# Altium footprint library My_SOMA_1806211.PcbLib: 50 footprints (part 1 of 4)
Each footprint in its own frame and in the unit in brackets; x right, y up, seen from the top. Pads: shape width x height; smd on the part's side, far side on the other; paste and mask are expansions set on the pad; w line width, h text height; cw(c..) or ccw(c..) is an arc to the next point about the centre after c.
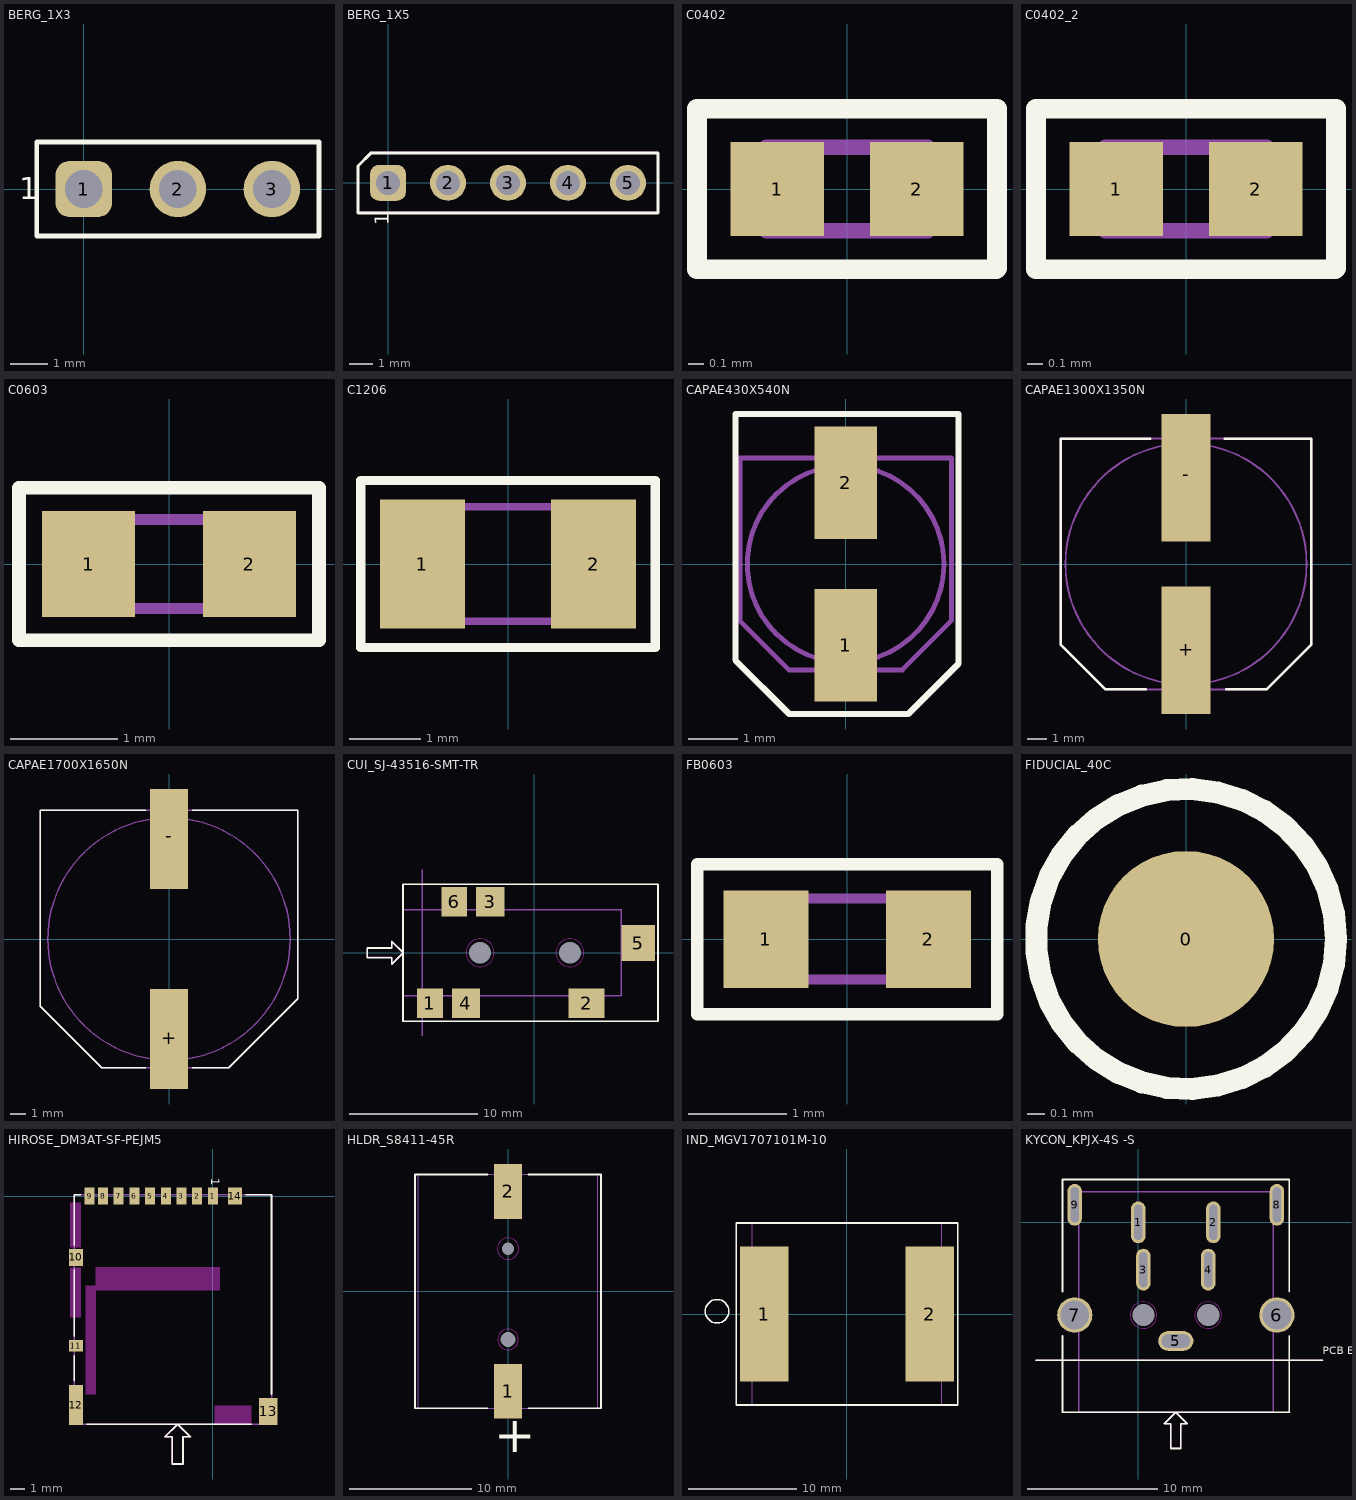
[diagram p0: the footprints below, top view; thin cyan lines are the x and y axes]

## BERG_1X3 [mil] "3 PIN CONNECTOR"
height 439.76
pads (3):
  rrect50% 60x60 hole 40 mask+2: 1(0,0)
  round 60 hole 40 mask+2: 2(100,0) 3(200,0)
Top Overlay:
  lines w5: -50,-50 250,-50 250,50 -50,50 -50,-50
  text "1" at -68.9,-18.9 h40
Mechanical 13:
  lines w4: -50,-50 250,-50 250,50 -50,50 -50,-50
  text "1" at -82.35,6.72 h40
  text ".Designator" at 264.98,27.44 h40
3D body "22-03-2031.stp": height 426.14, standoff -133.86, extent -45,-46.5 245,46.5

## BERG_1X5 [mil] "5 PIN CONNECTOR"
height 11.17
pads (5):
  rrect50% 60x60 hole 40 mask+2: 1(0,0)
  round 60 hole 40 mask+2: 2(100,0) 3(200,0) 4(300,0) 5(400,0)
Top Overlay:
  lines w5: -50,-50 -50,28.06 -28.06,50 450,50 450,-50 -50,-50
  text "1" at 9.74,-70.59 h40
Mechanical 13:
  lines w4: -50,-50 -50,28.06 -28.06,50 450,50 450,-50 -50,-50
  text "5" at 400,-13 h40
  text "1" at -5,-13 h40
  text ".Designator" at -73.18,-36.72 h40
3D body "22-03-2051.stp": height 426.14, standoff -133.86, extent -45.24,-46.75 444.75,46.25

## C0402 [mil]
height 590.55
pads (2):
  rect 24x24 smd mask+2: 1(-17.83,0) 2(17.83,0)
Top Overlay:
  lines w5: -38.33,-20.5 -38.33,20.5 38.33,20.5 38.33,-20.27 38.1,-20.5 -38.33,-20.5
Mechanical 13:
  lines w4: -20.67,-10.63 -20.67,10.63 20.67,10.63 20.67,-10.63 -20.67,-10.63
  text ".Designator" at -35.52,16.95 h40
3D body "C0402.STEP": height 20.1, standoff 0, extent -19.99,-9.99 20.01,10.01

## C0402_2 [mil]
pads (2):
  rect 24x24 smd mask+2: 1(-17.83,0) 2(17.83,0)
Top Overlay:
  lines w5: -38.33,-20.5 38.1,-20.5 38.33,-20.27 38.33,20.5 -38.33,20.5 -38.33,-20.5
Mechanical 13:
  lines w4: -20.67,-10.63 20.67,-10.63 20.67,10.63 -20.67,10.63 -20.67,-10.63
  text ".Designator" at -33.94,-47.33 h40
3D body "C0402.STEP": height 20.1, standoff 0, extent -19.99,-9.99 20.01,10.01

## C0603 [mil]
pads (2):
  rect 34x39 smd mask+2: 1(-29.48,0) 2(29.48,0)
Top Overlay:
  lines w5: -54.98,-28 -54.98,28 54.98,28 54.98,-28 -54.98,-28
Mechanical 13:
  lines w4: -31.5,-16.24 31.5,-16.24 31.5,16.24 -31.5,16.24 -31.5,-16.24
  text ".Designator" at 29.67,-27.66 h40
3D body "0603_SMD.stp": height 11.89, standoff 0, extent -31.54,-15.72 31.46,15.78

## C1206 [mil]
height 590.55
pads (2):
  rect 47x71 smd mask+2: 1(-47.09,0) 2(47.09,0)
Top Overlay:
  lines w5: -81.09,-46 -81.09,46 81.09,46 81.09,-46 -81.09,-46
Mechanical 13:
  lines w4: -62.99,-31.5 62.99,-31.5 62.99,31.5 -62.99,31.5 -62.99,-31.5
  text ".Designator" at 31.82,14.59 h40
3D body "C1206.STEP": height 39.45, standoff 0, extent -62.99,-31.49 63,31.5

## CAPAE430X540N [mm] "EEE-1VA100WR,CAP ALUM 10UF 20% 35V SMD"
height 5.4
pads (2):
  rect 1.27x2.286 smd mask+0.05: 1(0,-1.65) 2(0,1.65)
Top Overlay:
  lines w0.127: -2.239,-1.952 -1.143,-3.048 1.27,-3.048 2.297,-2.021 2.297,3.048 -2.239,3.048 -2.239,-1.952
Mechanical 13:
  circle w0.102: c0,0 r2
  lines w0.102: -2.15,-1.152 -1.152,-2.15 1.152,-2.15 2.15,-1.152 2.15,2.15 -2.15,2.15 -2.15,-1.152
  text ".Designator" at 0.127,-0.845 h1.02
3D body "猞4 SIZE CODE B.stp": height 5.81, standoff 0.01, extent -2.15,-2.5 2.15,2.5

## CAPAE1300X1350N [mm] "EMVA250ARA102MKE0S,CAP ALUM 1000UF 20% 25V SMD"
height 14
pads (2):
  rect 2.54x6.604 smd mask+0.05: +(0,-4.475) -(0,4.475)
Top Overlay:
  lines w0.127: -2.084,-6.5 -4.168,-6.5 -6.5,-4.168 -6.5,6.5 -1.847,6.5 ; 2.006,6.5 6.5,6.5 6.5,-4.168 4.168,-6.5 2.084,-6.5
Mechanical 13:
  circle w0.102: c0,0 r6.25
  lines w0.102: -6.5,-4.168 -4.168,-6.5 4.168,-6.5 6.5,-4.168 6.5,6.5 -6.5,6.5 -6.5,-4.168
  text ".Designator" at -0.306,0.532 h1.02
3D body: height 3, standoff 0, extent -6.5,-6.5 6.5,6.5
3D body: height 13.5, standoff 3, extent -6.25,-6.247 6.25,6.247

## CAPAE1700X1650N [mm] "EEV-TG1J471M,CAP ALUM 470UF 20% 63V SMD"
height 16.5
pads (2):
  rect 2.54x6.604 smd mask+0.05: +(0,-6.6) -(0,6.6)
Top Overlay:
  lines w0.127: -1.547,-8.5 -4.454,-8.5 -8.5,-4.454 -8.5,8.5 -1.535,8.5 ; 1.535,-8.5 3.946,-8.5 8.5,-3.946 8.5,8.5 1.547,8.5
Mechanical 13:
  circle w0.102: c0,0 r8
  lines w0.102: -8.5,-4.454 -8.5,8.5 8.5,8.5 8.5,-3.946 3.946,-8.5 -4.454,-8.5 -8.5,-4.454
  text ".Designator" at -0.071,0.847 h1.02
3D body "CAPAE180170X170M.step": height 17, standoff 0, extent -8.5,-9 8.5,9

## CUI_SJ-43516-SMT-TR [mm] "CONN JACK 4COND 3.5MM SMD R/A,SJ-43516-SMT-TR"
height 5
pads (8):
  rect 2x2.3 smd mask+0.051: 1(-8.1,-3.95) 6(-6.2,3.95)
  rect 2.8x2.3 smd mask+0.051: 2(4.1,-3.95)
  rect 2.2x2.3 smd mask+0.051: 3(-3.4,3.95) 4(-5.3,-3.95)
  rect 2.6x2.8 smd mask+0.051: 5(8.1,0.75)
  round 0 hole 1.7 unplated mask+0.051: ""(-4.2,0) ""(2.8,0)
Top Overlay:
  lines w0.127: -11.08,0.372 -12.985,0.372 -12.985,-0.39 -11.08,-0.39 -11.08,-0.898 -10.191,-0.009 -11.08,0.88 -11.08,0.373 ; -10.2,-5.334 9.652,-5.334 9.652,5.334 -10.2,5.334 -10.2,-5.334
Keep-Out Layer:
  circle w0.051: c2.8,0 r1.089
  circle w0.051: c-4.2,0 r1.089
Mechanical 13:
  lines w0.102: -11.08,0.39 -12.985,0.39 -12.985,-0.372 -11.08,-0.372 -11.08,-0.88 -10.191,0.009 -11.08,0.898 -11.08,0.392 ; -8.7,-6.477 -8.7,-3.35 -8.7,3.35 -8.7,6.477 ; -10.2,-3.35 6.8,-3.35 6.8,3.35 -10.2,3.35 -10.2,-3.35
  text ".Designator" at -1.302,0.331 h1.02
3D body "SJ-43516-SMT-TR.step": height 5.1, standoff -0.7, extent -10.4,-4.5 8.8,4.5

## FB0603 [mil]
height 590.55
pads (2):
  rect 34x39 smd mask+4: 1(-32.5,0) 2(32.5,0)
Top Overlay:
  lines w5: -60,-30 60,-30 60,30 -60,30 -60,-30
Mechanical 13:
  lines w4: -31.5,-16.24 31.5,-16.24 31.5,16.24 -31.5,16.24 -31.5,-16.24
  text ".Designator" at -32.67,-52.8 h40
3D body "User Library-R_0603.STEP": height 19.68, standoff 0, extent -31.49,-17.71 31.5,17.72

## FIDUCIAL_40C [mil] "GLOBAL FIDUCIAL"
height 590.55
pads (1):
  round 40 smd paste-78.74 mask+10: 0(0,0)
Top Layer keep-out:
  circle w2: c0,0 r34
Top Overlay:
  circle w5: c0,0 r34
Mechanical 13:
  circle w4: c0,0 r34
  text ".Designator" at 55.03,36.81 h40

## HIROSE_DM3AT-SF-PEJM5 [mm] "HIROSE_DM3AT-SF-PEJM5"
height 1.83
pads (14):
  rect 0.7x1.2 smd mask+0.051: 1(0,0) 2(-1.1,0) 3(-2.2,0) 4(-3.3,0) 5(-4.4,0) 6(-5.5,0) 7(-6.6,0) 8(-7.7,0) 9(-8.65,0)
  rect 1x1.2 smd mask+0.051: 10(-9.6,-4.3) 14(1.55,0)
  rect 1x0.8 smd mask+0.051: 11(-9.6,-10.5)
  rect 1x2.8 smd mask+0.051: 12(-9.6,-14.65)
  rect 1.3x1.9 smd mask+0.051: 13(3.901,-15.1)
Top Layer keep-out:
  region: -8.2,-6.6 0.5,-6.6 0.5,-5 -8.2,-5
  region: -10.001,-0.45 -10.001,-3.58 -9.25,-3.58 -9.25,-0.45
  region: -10.001,-5.031 -10.001,-8.5 -9.25,-8.5 -9.25,-5.031
  region: -8.9,-6.3 -8.9,-13.9 -8.2,-13.9 -8.2,-6.3
  region: 0.152,-16.049 2.699,-16.049 2.699,-14.699 0.152,-14.699
Top Overlay:
  lines w0.127: -9.725,-3.433 -9.725,0.1 -9.267,0.1 ; -9.723,-5.167 -9.718,-9.829 ; -9.722,-12.95 -9.722,-11.197 ; -8.82,-16.003 2.686,-16.003 ; -2.848,-16.882 -3.354,-16.882 -2.465,-15.993 -1.576,-16.882 -2.084,-16.882 -2.084,-18.787 -2.846,-18.787 -2.846,-16.882 ; 2.317,0.103 4.121,0.103 4.121,-13.883
  text "1" at -0.335,1.237 h1.02
Mechanical 13:
  lines w0.102: -2.867,-16.882 -3.373,-16.882 -2.484,-15.993 -1.595,-16.882 -2.103,-16.882 -2.103,-18.787 ; -2.865,-18.787 -2.865,-16.882 ; -9.724,-16.002 -9.724,0.1 4.126,0.1 4.126,-16.002 -9.724,-16.002
  text "CONFIRM PIN SEQUENCE" at 3.111,-1.202 h1.02
  text ".Designator" at -2.187,-6.29 h1.02
3D body "DM3AT-SF-PEJM5.stp": height 1.68, standoff 0, extent -9.724,-16.05 4.126,0.1

## HLDR_S8411-45R [mm] "S8411-45R,BATTERY HOLDER COIN 12MM SMD"
height 4.25
pads (4):
  rect 2.3x4.5 smd paste-1000 mask+0.051: 1(0,-8.2) 2(0,8.2)
  round 0 hole 1.25 unplated mask+0.051: ""(0,-3.95)
  round 0 hole 1.016 unplated mask+0.051: ""(0,3.5)
Top Overlay:
  lines w0.152: -1.696,9.6 -7.62,9.6 -7.62,-9.6 -1.69,-9.6 ; 1.69,9.6 7.62,9.6 7.62,-9.6 1.696,-9.6
  text "+" at -1.14,-14.17 h5.08
Keep-Out Layer:
  circle w0.051: c0,3.5 r0.886
  circle w0.051: c0,-3.95 r0.846
Mechanical 13:
  lines w0.102: -7.372,-9.6 -7.372,9.6 7.372,9.6 7.372,-9.6 -7.372,-9.6
  text "+" at -1.195,-13.143 h5.08
  text ".Designator" at -0.326,0.961 h1.02
3D body "S8411-45R--3DModel-STEP-56544.STEP": height 4.22, standoff -0.98, extent -7.372,-9.6 7.372,9.6

## IND_MGV1707101M-10 [mm] "MGV1707101M-10,FIXED IND 100UH 5.3A 118MOHM SMD"
height 7
pads (2):
  rect 4.5x12.5 smd paste-1000 mask+0.051: 1(-7.675,0) 2(7.675,0)
Top Overlay:
  circle w0.127: c-12.065,0.254 r1.092
  lines w0.152: -10.287,-8.45 10.287,-8.45 10.287,8.45 -10.287,8.45 -10.287,-8.45
Mechanical 13:
  circle w0.102: c-12.065,0.254 r1.092
  lines w0.102: -8.8,-8.45 8.8,-8.45 8.8,8.45 -8.8,8.45 -8.8,-8.45
  text ".Designator" at -0.836,0.352 h1.02
3D body: height 7, standoff 0, extent -8.8,-8.45 8.8,8.45

## KYCON_KPJX-4S -S [mil] "KPJX-4S -S,CONN JACK FMALE 4POS TIN SOLDER"
height 590.55
pads (11):
  oval 44x127 hole 107 slot 24 at 0 deg mask+2: 1(0,0) 2(228.35,0) 3(15.75,-143.7) 4(212.6,-143.7) 8(421.26,53.15) 9(-192.91,53.15)
  oval 107x60 hole 40 slot 87 at 0 deg mask+2: 5(114.17,-360.24)
  round 107 hole 87 mask+2: 6(421.26,-281.5) 7(-192.91,-281.5)
  round 0 hole 67 unplated mask+2: ""(15.75,-281.5) ""(212.6,-281.5)
Top Overlay:
  lines w5: -310.55,-419.29 559.45,-419.29 ; -230,-345 -230,-576.77 460,-576.77 ; -230,-210 -230,130 458.35,130 458.35,-210 ; 99.1,-611.77 79.17,-611.77 114.17,-576.77 149.17,-611.77 129.17,-611.77 129.17,-686.77 99.17,-686.77 99.17,-611.77 ; 458.35,-576.77 458.35,-345
  text "PCB EDGE" at 560.62,-410.17 h40
Keep-Out Layer:
  circle w2: c15.75,-281.5 r40.45
  circle w2: c212.6,-281.5 r40.45
Mechanical 13:
  lines w4: -310.55,-419.29 559.45,-419.29 ; 98.36,-611.78 78.43,-611.78 113.43,-576.78 148.43,-611.78 128.43,-611.78 128.43,-686.78 98.43,-686.78 98.43,-611.78 ; -181.1,-576.77 -181.1,92.52 409.45,92.52 409.45,-576.77 -181.1,-576.77
  text ".Designator" at 91.54,-130.55 h40
  text "PCB EDGE" at 570,-439.52 h40
3D body "KPJX-4S-S--3DModel-STEP-56544.STEP": height 590.55, standoff -137.82, extent -201.16,-577.15 428.76,107.89